# Altium footprint library M3铜柱.PcbLib: 136 footprints (part 1 of 9)
Each footprint in its own frame and in the unit in brackets; x right, y up, seen from the top. Pads: shape width x height; smd on the part's side, far side on the other; paste and mask are expansions set on the pad; w line width, h text height; cw(c..) or ccw(c..) is an arc to the next point about the centre after c.
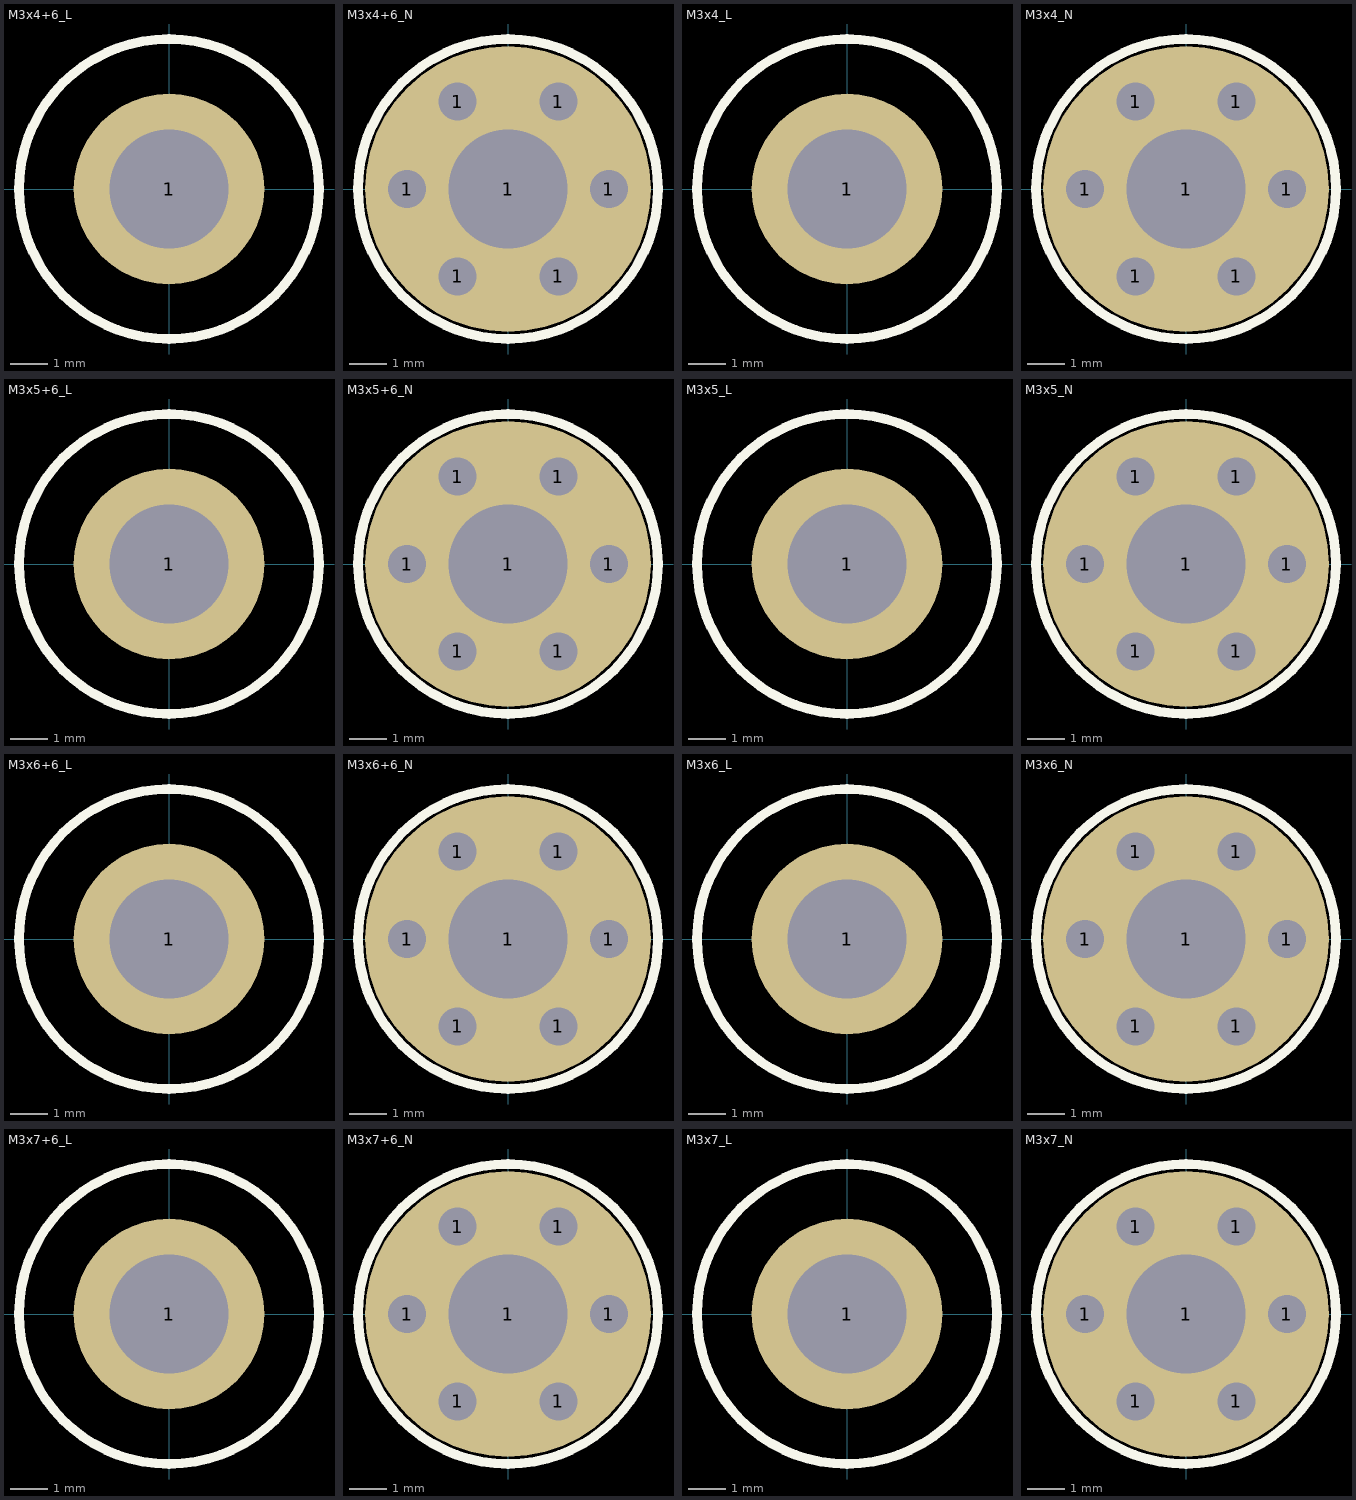
[diagram p0: the footprints below, top view; thin cyan lines are the x and y axes]

## M3x4+6_L [mil] "M3铜柱，长：4mm，螺纹长：6mm"
pads (1):
  round 200 hole 125: 1(0,0)
Top Overlay:
  circle w10: c0,0 r157.48
3D body: height 159.45, standoff -234.25, extent -106.22,-92.52 106.22,92.52

## M3x4+6_N [mil] "M3铜柱，长：4mm，螺纹长：6mm"
pads (7):
  round 40 hole 40: 1(-106,0) 1(-53,-91.8) 1(-53,91.8) 1(53,-91.8) 1(53,91.8) 1(106,0)
  round 300 hole 125: 1(0,0)
Top Overlay:
  circle w10: c0,0 r157.48
3D body: height 159.45, standoff -234.25, extent -106.22,-92.52 106.22,92.52

## M3x4_L [mil] "M3铜柱，长：4mm"
pads (1):
  round 200 hole 125: 1(0,0)
Top Overlay:
  circle w10: c0,0 r157.48
3D body: height 159.45, standoff 1.96, extent -106.22,-92.52 106.22,92.52

## M3x4_N [mil] "M3铜柱，长：4mm"
pads (7):
  round 40 hole 40: 1(-106,0) 1(-53,-91.8) 1(-53,91.8) 1(53,-91.8) 1(53,91.8) 1(106,0)
  round 300 hole 125: 1(0,0)
Top Overlay:
  circle w10: c0,0 r157.48
3D body: height 159.45, standoff 1.96, extent -106.22,-92.52 106.22,92.52

## M3x5+6_L [mil] "M3铜柱，长：5mm，螺纹长：6mm"
pads (1):
  round 200 hole 125: 1(0,0)
Top Overlay:
  circle w10: c0,0 r157.48
3D body: height 198.82, standoff -234.25, extent -106.22,-92.52 106.22,92.52

## M3x5+6_N [mil] "M3铜柱，长：5mm，螺纹长：6mm"
pads (7):
  round 40 hole 40: 1(-106,0) 1(-53,-91.8) 1(-53,91.8) 1(53,-91.8) 1(53,91.8) 1(106,0)
  round 300 hole 125: 1(0,0)
Top Overlay:
  circle w10: c0,0 r157.48
3D body: height 198.82, standoff -234.25, extent -106.22,-92.52 106.22,92.52

## M3x5_L [mil] "M3铜柱，长：5mm"
pads (1):
  round 200 hole 125: 1(0,0)
Top Overlay:
  circle w10: c0,0 r157.48
3D body: height 198.82, standoff 1.96, extent -106.22,-92.52 106.22,92.52

## M3x5_N [mil] "M3铜柱，长：5mm"
pads (7):
  round 40 hole 40: 1(-106,0) 1(-53,-91.8) 1(-53,91.8) 1(53,-91.8) 1(53,91.8) 1(106,0)
  round 300 hole 125: 1(0,0)
Top Overlay:
  circle w10: c0,0 r157.48
3D body: height 198.82, standoff 1.96, extent -106.22,-92.52 106.22,92.52

## M3x6+6_L [mil] "M3铜柱，长：6mm，螺纹长：6mm"
pads (1):
  round 200 hole 125: 1(0,0)
Top Overlay:
  circle w10: c0,0 r157.48
3D body: height 238.2, standoff -234.25, extent -106.22,-92.52 106.22,92.52

## M3x6+6_N [mil] "M3铜柱，长：6mm，螺纹长：6mm"
pads (7):
  round 40 hole 40: 1(-106,0) 1(-53,-91.8) 1(-53,91.8) 1(53,-91.8) 1(53,91.8) 1(106,0)
  round 300 hole 125: 1(0,0)
Top Overlay:
  circle w10: c0,0 r157.48
3D body: height 238.2, standoff -234.25, extent -106.22,-92.52 106.22,92.52

## M3x6_L [mil] "M3铜柱，长：6mm"
pads (1):
  round 200 hole 125: 1(0,0)
Top Overlay:
  circle w10: c0,0 r157.48
3D body: height 238.19, standoff 1.96, extent -106.22,-92.52 106.22,92.52

## M3x6_N [mil] "M3铜柱，长：6mm"
pads (7):
  round 40 hole 40: 1(-106,0) 1(-53,-91.8) 1(-53,91.8) 1(53,-91.8) 1(53,91.8) 1(106,0)
  round 300 hole 125: 1(0,0)
Top Overlay:
  circle w10: c0,0 r157.48
3D body: height 238.19, standoff 1.96, extent -106.22,-92.52 106.22,92.52

## M3x7+6_L [mil] "M3铜柱，长：7mm，螺纹长：6mm"
pads (1):
  round 200 hole 125: 1(0,0)
Top Overlay:
  circle w10: c0,0 r157.48
3D body: height 277.57, standoff -234.25, extent -106.22,-92.52 106.22,92.52

## M3x7+6_N [mil] "M3铜柱，长：7mm，螺纹长：6mm"
pads (7):
  round 40 hole 40: 1(-106,0) 1(-53,-91.8) 1(-53,91.8) 1(53,-91.8) 1(53,91.8) 1(106,0)
  round 300 hole 125: 1(0,0)
Top Overlay:
  circle w10: c0,0 r157.48
3D body: height 277.57, standoff -234.25, extent -106.22,-92.52 106.22,92.52

## M3x7_L [mil] "M3铜柱，长：7mm"
pads (1):
  round 200 hole 125: 1(0,0)
Top Overlay:
  circle w10: c0,0 r157.48
3D body: height 277.56, standoff 1.96, extent -106.22,-92.52 106.22,92.52

## M3x7_N [mil] "M3铜柱，长：7mm"
pads (7):
  round 40 hole 40: 1(-106,0) 1(-53,-91.8) 1(-53,91.8) 1(53,-91.8) 1(53,91.8) 1(106,0)
  round 300 hole 125: 1(0,0)
Top Overlay:
  circle w10: c0,0 r157.48
3D body: height 277.56, standoff 1.96, extent -106.22,-92.52 106.22,92.52